# Altium schematic symbol library MiscPower.SchLib: 1552 symbols (part 7 of 22) (continued)
## LM3488QMMX/NOPB (continued)

## LM3492MH/NOPB
designator U?
Two-Channel Individual Dimmable LED Driver with Boost Converter and Fast Current Regulator, 20 pin TSSOP EXP PAD; PartNumber: LM3492MH/NOPB; Manufacturer: National Semiconductor; PackageTopMarking: NSUZXYTT*LM3492*MH; PowerWise: Y; CompType: MiscPower; DatasheetVersion: Oct-2010; PackageVersion: revC, Jul-2006; PackageReference: MXA20A; PackageDescription: Molded TSSOP, Jedec, 6.5 x 4.4 x 0.9mm Body, 20 Lead, 0.65mm Pitch, Exposed Pad; RoHS: Y; PinCount: 20; High-Reliability: Y; Code_JEDEC: MO-153-ACT; ComponentLink1Description: Manufacturer URL; ComponentLink1URL: http://www.national.com/; ComponentLink2Description: LM3492 Datasheet; ComponentLink2URL: http://www.national.com/ds/LM/LM3492.pdf; ComponentLink3Description: LM3492 Web Page; ComponentLink3URL: http://www.national.com/pf/LM/LM3492.html; ComponentLink4Description: MXA20A Package Page; ComponentLink4URL: http://www.national.com/packaging/folders/mxa20a.html
footprint MXA20A_N (TSOP, 20-Leads, Body 6.5x4.4mm, Pitch 0.65mm, Thermal Pad, IPC Medium Density)
footprint MXA20A_L (TSOP, 20-Leads, Body 6.5x4.4mm, Pitch 0.65mm, Thermal Pad, IPC High Density)
footprint MXA20A_M (TSOP, 20-Leads, Body 6.5x4.4mm, Pitch 0.65mm, Thermal Pad, IPC Low Density)
pins: 1 EN (in), 2 VIN (in), 3 SW (oc), 4 SW (oc), 5 VOUT (in), 6 RT, 7 FB (in), 8 GND (power), 9 IOUT2 (in), 10 IOUT1 (in), 11 CDHC, 12 IREF, 13 COMM (io), 14 LGND (power), 15 DIM1/CLK (in), 16 DIM2 (in), 17 PGND (power), 18 PGND (power), 19 VCC (power), 20 ILIM (in), 21 DAP (power)

## LM3492MHX/NOPB
designator U?
Two-Channel Individual Dimmable LED Driver with Boost Converter and Fast Current Regulator, 20 pin TSSOP EXP PAD; PartNumber: LM3492MHX/NOPB; Manufacturer: National Semiconductor; PackageTopMarking: NSUZXYTT*LM3492*MH; PowerWise: Y; CompType: MiscPower; DatasheetVersion: Oct-2010; PackageVersion: revC, Jul-2006; PackageReference: MXA20A; PackageDescription: Molded TSSOP, Jedec, 6.5 x 4.4 x 0.9mm Body, 20 Lead, 0.65mm Pitch, Exposed Pad; RoHS: Y; PinCount: 20; High-Reliability: Y; Code_JEDEC: MO-153-ACT; ComponentLink1Description: Manufacturer URL; ComponentLink1URL: http://www.national.com/; ComponentLink2Description: LM3492 Datasheet; ComponentLink2URL: http://www.national.com/ds/LM/LM3492.pdf; ComponentLink3Description: LM3492 Web Page; ComponentLink3URL: http://www.national.com/pf/LM/LM3492.html; ComponentLink4Description: MXA20A Package Page; ComponentLink4URL: http://www.national.com/packaging/folders/mxa20a.html
footprint MXA20A_N (TSOP, 20-Leads, Body 6.5x4.4mm, Pitch 0.65mm, Thermal Pad, IPC Medium Density)
footprint MXA20A_L (TSOP, 20-Leads, Body 6.5x4.4mm, Pitch 0.65mm, Thermal Pad, IPC High Density)
footprint MXA20A_M (TSOP, 20-Leads, Body 6.5x4.4mm, Pitch 0.65mm, Thermal Pad, IPC Low Density)
pins: 1 EN (in), 2 VIN (in), 3 SW (oc), 4 SW (oc), 5 VOUT (in), 6 RT, 7 FB (in), 8 GND (power), 9 IOUT2 (in), 10 IOUT1 (in), 11 CDHC, 12 IREF, 13 COMM (io), 14 LGND (power), 15 DIM1/CLK (in), 16 DIM2 (in), 17 PGND (power), 18 PGND (power), 19 VCC (power), 20 ILIM (in), 21 DAP (power)

## LM3492QMH/NOPB
designator U?
Two-Channel Individual Dimmable LED Driver with Boost Converter and Fast Current Regulator, AECQ 1, 20-pin TSSOP-EP, 73 Rail; PartNumber: LM3492QMH/NOPB; Manufacturer: National Semiconductor; PackageTopMarking: NSUZXYTT*LM3492*QMH; PowerWise: N; CompType: MiscPower; High-Reliability: Y; DatasheetVersion: Oct-2010; PackageVersion: revC, Jul-2006; PackageReference: MXA20A; PackageDescription: Molded TSSOP, Jedec, 6.5 x 4.4 x 0.9mm Body, 20 Lead, 0.65mm Pitch, Exposed Pad; RoHS: Y; PinCount: 20; Code_JEDEC: MO-153-ACT; ComponentLink1Description: Manufacturer URL; ComponentLink1URL: http://www.national.com/; ComponentLink2Description: LM3492 Datasheet; ComponentLink2URL: http://www.national.com/ds/LM/LM3492.pdf; ComponentLink3Description: LM3492 Web Page; ComponentLink3URL: http://www.national.com/pf/LM/LM3492.html; ComponentLink4Description: MXA20A Package Page; ComponentLink4URL: http://www.national.com/packaging/folders/mxa20a.html
footprint MXA20A_N (TSOP, 20-Leads, Body 6.5x4.4mm, Pitch 0.65mm, Thermal Pad, IPC Medium Density)
footprint MXA20A_L (TSOP, 20-Leads, Body 6.5x4.4mm, Pitch 0.65mm, Thermal Pad, IPC High Density)
footprint MXA20A_M (TSOP, 20-Leads, Body 6.5x4.4mm, Pitch 0.65mm, Thermal Pad, IPC Low Density)
pins: 1 EN (in), 2 VIN (in), 3 SW (oc), 4 SW (oc), 5 VOUT (in), 6 RT, 7 FB (in), 8 GND (power), 9 IOUT2 (in), 10 IOUT1 (in), 11 CDHC, 12 IREF, 13 COMM (io), 14 LGND (power), 15 DIM1/CLK (in), 16 DIM2 (in), 17 PGND (power), 18 PGND (power), 19 VCC (power), 20 ILIM (in), 21 DAP (power)

## LM3492QMHX/NOPB
designator U?
Two-Channel Individual Dimmable LED Driver with Boost Converter and Fast Current Regulator, AECQ 1, 20-pin TSSOP-EP, 2500 Reel; PartNumber: LM3492QMHX/NOPB; Manufacturer: National Semiconductor; PackageTopMarking: NSUZXYTT*LM3492*QMH; PowerWise: N; CompType: MiscPower; High-Reliability: Y; DatasheetVersion: Oct-2010; PackageVersion: revC, Jul-2006; PackageReference: MXA20A; PackageDescription: Molded TSSOP, Jedec, 6.5 x 4.4 x 0.9mm Body, 20 Lead, 0.65mm Pitch, Exposed Pad; RoHS: Y; PinCount: 20; Code_JEDEC: MO-153-ACT; ComponentLink1Description: Manufacturer URL; ComponentLink1URL: http://www.national.com/; ComponentLink2Description: LM3492 Datasheet; ComponentLink2URL: http://www.national.com/ds/LM/LM3492.pdf; ComponentLink3Description: LM3492 Web Page; ComponentLink3URL: http://www.national.com/pf/LM/LM3492.html; ComponentLink4Description: MXA20A Package Page; ComponentLink4URL: http://www.national.com/packaging/folders/mxa20a.html
footprint MXA20A_N (TSOP, 20-Leads, Body 6.5x4.4mm, Pitch 0.65mm, Thermal Pad, IPC Medium Density)
footprint MXA20A_L (TSOP, 20-Leads, Body 6.5x4.4mm, Pitch 0.65mm, Thermal Pad, IPC High Density)
footprint MXA20A_M (TSOP, 20-Leads, Body 6.5x4.4mm, Pitch 0.65mm, Thermal Pad, IPC Low Density)
pins: 1 EN (in), 2 VIN (in), 3 SW (oc), 4 SW (oc), 5 VOUT (in), 6 RT, 7 FB (in), 8 GND (power), 9 IOUT2 (in), 10 IOUT1 (in), 11 CDHC, 12 IREF, 13 COMM (io), 14 LGND (power), 15 DIM1/CLK (in), 16 DIM2 (in), 17 PGND (power), 18 PGND (power), 19 VCC (power), 20 ILIM (in), 21 DAP (power)

## LM3500TL-16/NOPB
designator U?
Synchronous Step-up DC/DC Converter for White LED Applications, 8-pin Micro SMD, Pb-Free; PartNumber: LM3500TL-16/NOPB; Manufacturer: National Semiconductor; PackageTopMarking: XVS*I 18; PowerWise: N; CompType: MiscPower; High-Reliability: Y; DatasheetVersion: Feb-2005; PackageVersion: revC, Jan-2004; PackageReference: TLA08SSA; PackageDescription: Thin Micro SMD, 8 Bump (Large), 0.5mm Pitch; RoHS: Y; PinCount: 8; Code_JEDEC: MO-211-DD; ComponentLink1Description: Manufacturer URL; ComponentLink1URL: http://www.national.com/; ComponentLink2Description: LM3500 Datasheet; ComponentLink2URL: http://www.national.com/ds/LM/LM3500.pdf; ComponentLink3Description: LM3500 Web Page; ComponentLink3URL: http://www.national.com/pf/LM/LM3500.html; ComponentLink4Description: TLA08SSA Package Page; ComponentLink4URL: http://www.national.com/packaging/folders/tla08ssa.html
footprint TLA08SSA (Micro SMD, 8-Leads, Body 1.92x1.92mm, Pitch 0.5mm, NSC Recommended)
pins: A1 AGND (power), A2 ~{SHDN} (in), A3 NC, B1 VIN (power), B3 FB (in), C1 VOUT (out), C2 VSW, C3 GND (power)

## LM3500TL-21/NOPB
designator U?
Synchronous Step-up DC/DC Converter for White LED Applications, 8-pin Micro SMD, Pb-Free; PartNumber: LM3500TL-21/NOPB; Manufacturer: National Semiconductor; PackageTopMarking: XVS*I 23; PowerWise: N; CompType: MiscPower; High-Reliability: Y; DatasheetVersion: Feb-2005; PackageVersion: revC, Jan-2004; PackageReference: TLA08SSA; PackageDescription: Thin Micro SMD, 8 Bump (Large), 0.5mm Pitch; RoHS: Y; PinCount: 8; Code_JEDEC: MO-211-DD; ComponentLink1Description: Manufacturer URL; ComponentLink1URL: http://www.national.com/; ComponentLink2Description: LM3500 Datasheet; ComponentLink2URL: http://www.national.com/ds/LM/LM3500.pdf; ComponentLink3Description: LM3500 Web Page; ComponentLink3URL: http://www.national.com/pf/LM/LM3500.html; ComponentLink4Description: TLA08SSA Package Page; ComponentLink4URL: http://www.national.com/packaging/folders/tla08ssa.html
footprint TLA08SSA (Micro SMD, 8-Leads, Body 1.92x1.92mm, Pitch 0.5mm, NSC Recommended)
pins: A1 AGND (power), A2 ~{SHDN} (in), A3 NC, B1 VIN (power), B3 FB (in), C1 VOUT (out), C2 VSW, C3 GND (power)

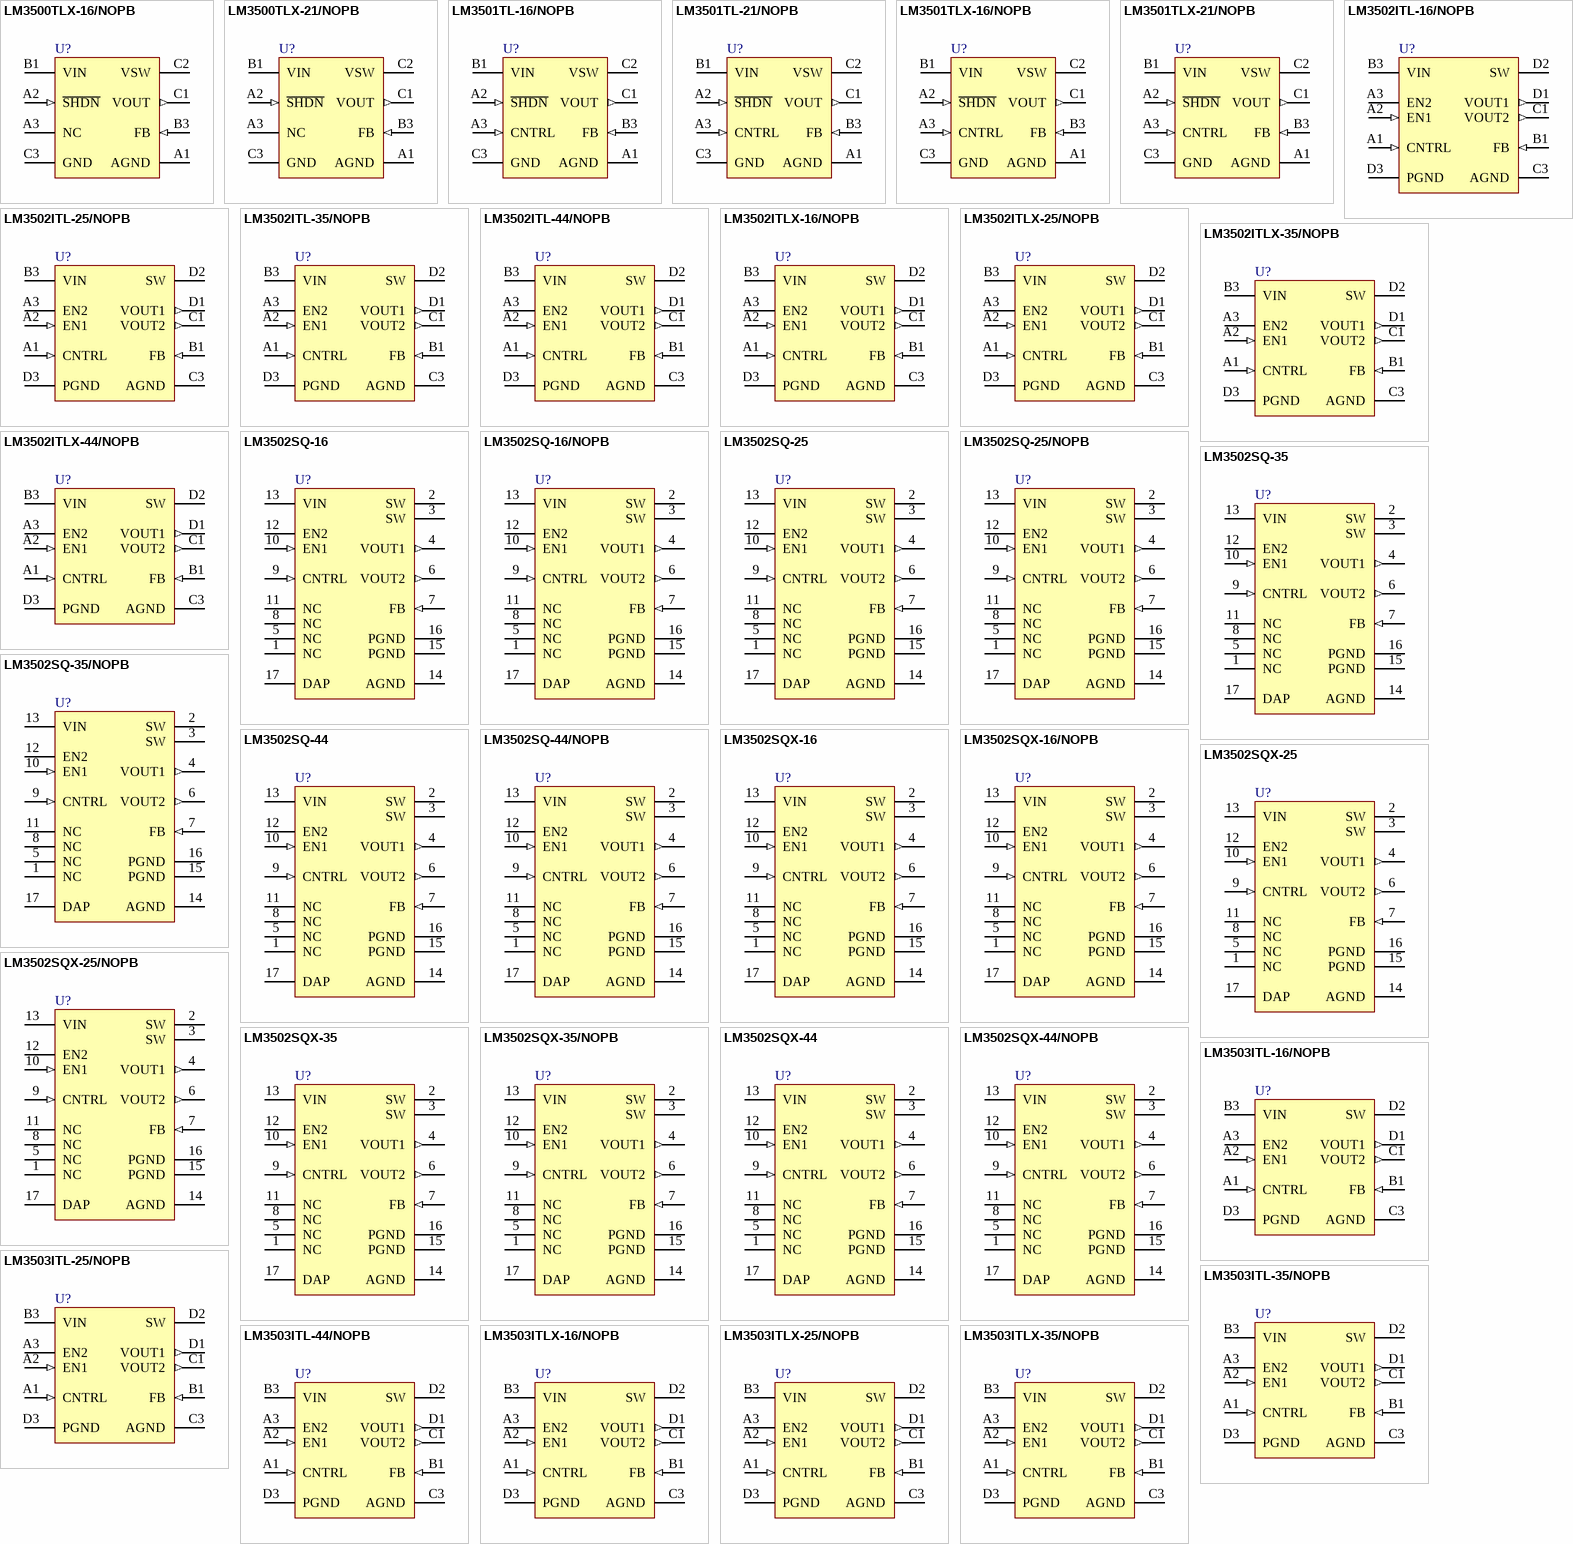
[diagram p15: symbols LM3500TLX-16/NOPB to LM3503ITLX-35/NOPB]

## LM3500TLX-16/NOPB
designator U?
Synchronous Step-up DC/DC Converter for White LED Applications, 8-pin Micro SMD, Pb-Free; PartNumber: LM3500TLX-16/NOPB; Manufacturer: National Semiconductor; PackageTopMarking: XVS*I 18; PowerWise: N; CompType: MiscPower; High-Reliability: Y; DatasheetVersion: Feb-2005; PackageVersion: revC, Jan-2004; PackageReference: TLA08SSA; PackageDescription: Thin Micro SMD, 8 Bump (Large), 0.5mm Pitch; RoHS: Y; PinCount: 8; Code_JEDEC: MO-211-DD; ComponentLink1Description: Manufacturer URL; ComponentLink1URL: http://www.national.com/; ComponentLink2Description: LM3500 Datasheet; ComponentLink2URL: http://www.national.com/ds/LM/LM3500.pdf; ComponentLink3Description: LM3500 Web Page; ComponentLink3URL: http://www.national.com/pf/LM/LM3500.html; ComponentLink4Description: TLA08SSA Package Page; ComponentLink4URL: http://www.national.com/packaging/folders/tla08ssa.html
footprint TLA08SSA (Micro SMD, 8-Leads, Body 1.92x1.92mm, Pitch 0.5mm, NSC Recommended)
pins: A1 AGND (power), A2 ~{SHDN} (in), A3 NC, B1 VIN (power), B3 FB (in), C1 VOUT (out), C2 VSW, C3 GND (power)

## LM3500TLX-21/NOPB
designator U?
Synchronous Step-up DC/DC Converter for White LED Applications, 8-pin Micro SMD, Pb-Free; PartNumber: LM3500TLX-21/NOPB; Manufacturer: National Semiconductor; PackageTopMarking: XVS*I 23; PowerWise: N; CompType: MiscPower; High-Reliability: Y; DatasheetVersion: Feb-2005; PackageVersion: revC, Jan-2004; PackageReference: TLA08SSA; PackageDescription: Thin Micro SMD, 8 Bump (Large), 0.5mm Pitch; RoHS: Y; PinCount: 8; Code_JEDEC: MO-211-DD; ComponentLink1Description: Manufacturer URL; ComponentLink1URL: http://www.national.com/; ComponentLink2Description: LM3500 Datasheet; ComponentLink2URL: http://www.national.com/ds/LM/LM3500.pdf; ComponentLink3Description: LM3500 Web Page; ComponentLink3URL: http://www.national.com/pf/LM/LM3500.html; ComponentLink4Description: TLA08SSA Package Page; ComponentLink4URL: http://www.national.com/packaging/folders/tla08ssa.html
footprint TLA08SSA (Micro SMD, 8-Leads, Body 1.92x1.92mm, Pitch 0.5mm, NSC Recommended)
pins: A1 AGND (power), A2 ~{SHDN} (in), A3 NC, B1 VIN (power), B3 FB (in), C1 VOUT (out), C2 VSW, C3 GND (power)

## LM3501TL-16/NOPB
designator U?
Synchronous Step-up DC/DC Converter for White LED Applications, 8-pin Micro SMD, Pb-Free; PartNumber: LM3501TL-16/NOPB; Manufacturer: National Semiconductor; PackageTopMarking: XVS*I 19; PowerWise: N; CompType: MiscPower; High-Reliability: Y; DatasheetVersion: May-2005; PackageVersion: revC, Jan-2004; PackageReference: TLA08SSA; PackageDescription: Thin Micro SMD, 8 Bump (Large), 0.5mm Pitch; RoHS: Y; PinCount: 8; Code_JEDEC: MO-211-DD; ComponentLink1Description: Manufacturer URL; ComponentLink1URL: http://www.national.com/; ComponentLink2Description: LM3501 Datasheet; ComponentLink2URL: http://www.national.com/ds/LM/LM3501.pdf; ComponentLink3Description: LM3501 Web Page; ComponentLink3URL: http://www.national.com/pf/LM/LM3501.html; ComponentLink4Description: TLA08SSA Package Page; ComponentLink4URL: http://www.national.com/packaging/folders/tla08ssa.html
footprint TLA08SSA (Micro SMD, 8-Leads, Body 1.92x1.92mm, Pitch 0.5mm, NSC Recommended)
pins: A1 AGND (power), A2 ~{SHDN} (in), A3 CNTRL (in), B1 VIN (power), B3 FB (in), C1 VOUT (out), C2 VSW, C3 GND (power)

## LM3501TL-21/NOPB
designator U?
Synchronous Step-up DC/DC Converter for White LED Applications, 8-pin Micro SMD, Pb-Free; PartNumber: LM3501TL-21/NOPB; Manufacturer: National Semiconductor; PackageTopMarking: XVS*I 30; PowerWise: N; CompType: MiscPower; High-Reliability: Y; DatasheetVersion: May-2005; PackageVersion: revC, Jan-2004; PackageReference: TLA08SSA; PackageDescription: Thin Micro SMD, 8 Bump (Large), 0.5mm Pitch; RoHS: Y; PinCount: 8; Code_JEDEC: MO-211-DD; ComponentLink1Description: Manufacturer URL; ComponentLink1URL: http://www.national.com/; ComponentLink2Description: LM3501 Datasheet; ComponentLink2URL: http://www.national.com/ds/LM/LM3501.pdf; ComponentLink3Description: LM3501 Web Page; ComponentLink3URL: http://www.national.com/pf/LM/LM3501.html; ComponentLink4Description: TLA08SSA Package Page; ComponentLink4URL: http://www.national.com/packaging/folders/tla08ssa.html
footprint TLA08SSA (Micro SMD, 8-Leads, Body 1.92x1.92mm, Pitch 0.5mm, NSC Recommended)
pins: A1 AGND (power), A2 ~{SHDN} (in), A3 CNTRL (in), B1 VIN (power), B3 FB (in), C1 VOUT (out), C2 VSW, C3 GND (power)

## LM3501TLX-16/NOPB
designator U?
Synchronous Step-up DC/DC Converter for White LED Applications, 8-pin Micro SMD, Pb-Free; PartNumber: LM3501TLX-16/NOPB; Manufacturer: National Semiconductor; PackageTopMarking: XVS*I 19; PowerWise: N; CompType: MiscPower; High-Reliability: Y; DatasheetVersion: May-2005; PackageVersion: revC, Jan-2004; PackageReference: TLA08SSA; PackageDescription: Thin Micro SMD, 8 Bump (Large), 0.5mm Pitch; RoHS: Y; PinCount: 8; Code_JEDEC: MO-211-DD; ComponentLink1Description: Manufacturer URL; ComponentLink1URL: http://www.national.com/; ComponentLink2Description: LM3501 Datasheet; ComponentLink2URL: http://www.national.com/ds/LM/LM3501.pdf; ComponentLink3Description: LM3501 Web Page; ComponentLink3URL: http://www.national.com/pf/LM/LM3501.html; ComponentLink4Description: TLA08SSA Package Page; ComponentLink4URL: http://www.national.com/packaging/folders/tla08ssa.html
footprint TLA08SSA (Micro SMD, 8-Leads, Body 1.92x1.92mm, Pitch 0.5mm, NSC Recommended)
pins: A1 AGND (power), A2 ~{SHDN} (in), A3 CNTRL (in), B1 VIN (power), B3 FB (in), C1 VOUT (out), C2 VSW, C3 GND (power)

## LM3501TLX-21/NOPB
designator U?
Synchronous Step-up DC/DC Converter for White LED Applications, 8-pin Micro SMD, Pb-Free; PartNumber: LM3501TLX-21/NOPB; Manufacturer: National Semiconductor; PackageTopMarking: XVS*I 30; PowerWise: N; CompType: MiscPower; High-Reliability: Y; DatasheetVersion: May-2005; PackageVersion: revC, Jan-2004; PackageReference: TLA08SSA; PackageDescription: Thin Micro SMD, 8 Bump (Large), 0.5mm Pitch; RoHS: Y; PinCount: 8; Code_JEDEC: MO-211-DD; ComponentLink1Description: Manufacturer URL; ComponentLink1URL: http://www.national.com/; ComponentLink2Description: LM3501 Datasheet; ComponentLink2URL: http://www.national.com/ds/LM/LM3501.pdf; ComponentLink3Description: LM3501 Web Page; ComponentLink3URL: http://www.national.com/pf/LM/LM3501.html; ComponentLink4Description: TLA08SSA Package Page; ComponentLink4URL: http://www.national.com/packaging/folders/tla08ssa.html
footprint TLA08SSA (Micro SMD, 8-Leads, Body 1.92x1.92mm, Pitch 0.5mm, NSC Recommended)
pins: A1 AGND (power), A2 ~{SHDN} (in), A3 CNTRL (in), B1 VIN (power), B3 FB (in), C1 VOUT (out), C2 VSW, C3 GND (power)

## LM3502ITL-16/NOPB
designator U?
Step-Up Converter for White LED Applications, 10-pin Micro SMD, Pb-Free; PartNumber: LM3502ITL-16/NOPB; Manufacturer: National Semiconductor; PackageTopMarking: XYTT*I SANB; PowerWise: Y; CompType: MiscPower; DatasheetVersion: Aug-2006; PackageVersion: revD, Mar-2004; PackageReference: TLP10RDA; PackageDescription: Thin Micro SMD, 10 Bump (Large), Periperal, 0.5mm Pitch; RoHS: Y; PinCount: 10; High-Reliability: Y; Code_JEDEC: MO-211-BD; ComponentLink1Description: Manufacturer URL; ComponentLink1URL: http://www.national.com/; ComponentLink2Description: LM3502 Datasheet; ComponentLink2URL: http://www.national.com/ds/LM/LM3502.pdf; ComponentLink3Description: LM3502 Web Page; ComponentLink3URL: http://www.national.com/pf/LM/LM3502.html; ComponentLink4Description: TLP10RDA Package Page; ComponentLink4URL: http://www.national.com/packaging/folders/tlp10rda.html
footprint TLP10RDA (Micro SMD, 10-Leads, Body 2.07x1.9mm, Pitch 0.5mm, NSC Recommended)
pins: A1 CNTRL (in), A2 EN1 (in), A3 EN2, B1 FB (in), B3 VIN (power), C1 VOUT2 (out), C3 AGND (power), D1 VOUT1 (out), D2 SW (power), D3 PGND (power)

## LM3502ITL-25/NOPB
designator U?
Step-Up Converter for White LED Applications, 10-pin Micro SMD, Pb-Free; PartNumber: LM3502ITL-25/NOPB; Manufacturer: National Semiconductor; PackageTopMarking: XYTT*I SAPB; PowerWise: Y; CompType: MiscPower; DatasheetVersion: Aug-2006; PackageVersion: revD, Mar-2004; PackageReference: TLP10RDA; PackageDescription: Thin Micro SMD, 10 Bump (Large), Periperal, 0.5mm Pitch; RoHS: Y; PinCount: 10; High-Reliability: Y; Code_JEDEC: MO-211-BD; ComponentLink1Description: Manufacturer URL; ComponentLink1URL: http://www.national.com/; ComponentLink2Description: LM3502 Datasheet; ComponentLink2URL: http://www.national.com/ds/LM/LM3502.pdf; ComponentLink3Description: LM3502 Web Page; ComponentLink3URL: http://www.national.com/pf/LM/LM3502.html; ComponentLink4Description: TLP10RDA Package Page; ComponentLink4URL: http://www.national.com/packaging/folders/tlp10rda.html
footprint TLP10RDA (Micro SMD, 10-Leads, Body 2.07x1.9mm, Pitch 0.5mm, NSC Recommended)
pins: A1 CNTRL (in), A2 EN1 (in), A3 EN2, B1 FB (in), B3 VIN (power), C1 VOUT2 (out), C3 AGND (power), D1 VOUT1 (out), D2 SW (power), D3 PGND (power)

## LM3502ITL-35/NOPB
designator U?
Step-Up Converter for White LED Applications, 10-pin Micro SMD, Pb-Free; PartNumber: LM3502ITL-35/NOPB; Manufacturer: National Semiconductor; PackageTopMarking: XYTT*I SARB; PowerWise: Y; CompType: MiscPower; DatasheetVersion: Aug-2006; PackageVersion: revD, Mar-2004; PackageReference: TLP10RDA; PackageDescription: Thin Micro SMD, 10 Bump (Large), Periperal, 0.5mm Pitch; RoHS: Y; PinCount: 10; High-Reliability: Y; Code_JEDEC: MO-211-BD; ComponentLink1Description: Manufacturer URL; ComponentLink1URL: http://www.national.com/; ComponentLink2Description: LM3502 Datasheet; ComponentLink2URL: http://www.national.com/ds/LM/LM3502.pdf; ComponentLink3Description: LM3502 Web Page; ComponentLink3URL: http://www.national.com/pf/LM/LM3502.html; ComponentLink4Description: TLP10RDA Package Page; ComponentLink4URL: http://www.national.com/packaging/folders/tlp10rda.html
footprint TLP10RDA (Micro SMD, 10-Leads, Body 2.07x1.9mm, Pitch 0.5mm, NSC Recommended)
pins: A1 CNTRL (in), A2 EN1 (in), A3 EN2, B1 FB (in), B3 VIN (power), C1 VOUT2 (out), C3 AGND (power), D1 VOUT1 (out), D2 SW (power), D3 PGND (power)

## LM3502ITL-44/NOPB
designator U?
Step-Up Converter for White LED Applications, 10-pin Micro SMD, Pb-Free; PartNumber: LM3502ITL-44/NOPB; Manufacturer: National Semiconductor; PackageTopMarking: XYTT*I SDLB; PowerWise: Y; CompType: MiscPower; DatasheetVersion: Aug-2006; PackageVersion: revD, Mar-2004; PackageReference: TLP10RDA; PackageDescription: Thin Micro SMD, 10 Bump (Large), Periperal, 0.5mm Pitch; RoHS: Y; PinCount: 10; High-Reliability: Y; Code_JEDEC: MO-211-BD; ComponentLink1Description: Manufacturer URL; ComponentLink1URL: http://www.national.com/; ComponentLink2Description: LM3502 Datasheet; ComponentLink2URL: http://www.national.com/ds/LM/LM3502.pdf; ComponentLink3Description: LM3502 Web Page; ComponentLink3URL: http://www.national.com/pf/LM/LM3502.html; ComponentLink4Description: TLP10RDA Package Page; ComponentLink4URL: http://www.national.com/packaging/folders/tlp10rda.html
footprint TLP10RDA (Micro SMD, 10-Leads, Body 2.07x1.9mm, Pitch 0.5mm, NSC Recommended)
pins: A1 CNTRL (in), A2 EN1 (in), A3 EN2, B1 FB (in), B3 VIN (power), C1 VOUT2 (out), C3 AGND (power), D1 VOUT1 (out), D2 SW (power), D3 PGND (power)

## LM3502ITLX-16/NOPB
designator U?
Step-Up Converter for White LED Applications, 10-pin Micro SMD, Pb-Free; PartNumber: LM3502ITLX-16/NOPB; Manufacturer: National Semiconductor; PackageTopMarking: XYTT*I SANB; PowerWise: Y; CompType: MiscPower; DatasheetVersion: Aug-2006; PackageVersion: revD, Mar-2004; PackageReference: TLP10RDA; PackageDescription: Thin Micro SMD, 10 Bump (Large), Periperal, 0.5mm Pitch; RoHS: Y; PinCount: 10; High-Reliability: Y; Code_JEDEC: MO-211-BD; ComponentLink1Description: Manufacturer URL; ComponentLink1URL: http://www.national.com/; ComponentLink2Description: LM3502 Datasheet; ComponentLink2URL: http://www.national.com/ds/LM/LM3502.pdf; ComponentLink3Description: LM3502 Web Page; ComponentLink3URL: http://www.national.com/pf/LM/LM3502.html; ComponentLink4Description: TLP10RDA Package Page; ComponentLink4URL: http://www.national.com/packaging/folders/tlp10rda.html
footprint TLP10RDA (Micro SMD, 10-Leads, Body 2.07x1.9mm, Pitch 0.5mm, NSC Recommended)
pins: A1 CNTRL (in), A2 EN1 (in), A3 EN2, B1 FB (in), B3 VIN (power), C1 VOUT2 (out), C3 AGND (power), D1 VOUT1 (out), D2 SW (power), D3 PGND (power)

## LM3502ITLX-25/NOPB
designator U?
Step-Up Converter for White LED Applications, 10-pin Micro SMD, Pb-Free; PartNumber: LM3502ITLX-25/NOPB; Manufacturer: National Semiconductor; PackageTopMarking: XYTT*I SAPB; PowerWise: Y; CompType: MiscPower; DatasheetVersion: Aug-2006; PackageVersion: revD, Mar-2004; PackageReference: TLP10RDA; PackageDescription: Thin Micro SMD, 10 Bump (Large), Periperal, 0.5mm Pitch; RoHS: Y; PinCount: 10; High-Reliability: Y; Code_JEDEC: MO-211-BD; ComponentLink1Description: Manufacturer URL; ComponentLink1URL: http://www.national.com/; ComponentLink2Description: LM3502 Datasheet; ComponentLink2URL: http://www.national.com/ds/LM/LM3502.pdf; ComponentLink3Description: LM3502 Web Page; ComponentLink3URL: http://www.national.com/pf/LM/LM3502.html; ComponentLink4Description: TLP10RDA Package Page; ComponentLink4URL: http://www.national.com/packaging/folders/tlp10rda.html
footprint TLP10RDA (Micro SMD, 10-Leads, Body 2.07x1.9mm, Pitch 0.5mm, NSC Recommended)
pins: A1 CNTRL (in), A2 EN1 (in), A3 EN2, B1 FB (in), B3 VIN (power), C1 VOUT2 (out), C3 AGND (power), D1 VOUT1 (out), D2 SW (power), D3 PGND (power)

## LM3502ITLX-35/NOPB
designator U?
Step-Up Converter for White LED Applications, 10-pin Micro SMD, Pb-Free; PartNumber: LM3502ITLX-35/NOPB; Manufacturer: National Semiconductor; PackageTopMarking: XYTT*I SARB; PowerWise: Y; CompType: MiscPower; DatasheetVersion: Aug-2006; PackageVersion: revD, Mar-2004; PackageReference: TLP10RDA; PackageDescription: Thin Micro SMD, 10 Bump (Large), Periperal, 0.5mm Pitch; RoHS: Y; PinCount: 10; High-Reliability: Y; Code_JEDEC: MO-211-BD; ComponentLink1Description: Manufacturer URL; ComponentLink1URL: http://www.national.com/; ComponentLink2Description: LM3502 Datasheet; ComponentLink2URL: http://www.national.com/ds/LM/LM3502.pdf; ComponentLink3Description: LM3502 Web Page; ComponentLink3URL: http://www.national.com/pf/LM/LM3502.html; ComponentLink4Description: TLP10RDA Package Page; ComponentLink4URL: http://www.national.com/packaging/folders/tlp10rda.html
footprint TLP10RDA (Micro SMD, 10-Leads, Body 2.07x1.9mm, Pitch 0.5mm, NSC Recommended)
pins: A1 CNTRL (in), A2 EN1 (in), A3 EN2, B1 FB (in), B3 VIN (power), C1 VOUT2 (out), C3 AGND (power), D1 VOUT1 (out), D2 SW (power), D3 PGND (power)

## LM3502ITLX-44/NOPB
designator U?
Step-Up Converter for White LED Applications, 10-pin Micro SMD, Pb-Free; PartNumber: LM3502ITLX-44/NOPB; Manufacturer: National Semiconductor; PackageTopMarking: XYTT*I SDLB; PowerWise: Y; CompType: MiscPower; DatasheetVersion: Aug-2006; PackageVersion: revD, Mar-2004; PackageReference: TLP10RDA; PackageDescription: Thin Micro SMD, 10 Bump (Large), Periperal, 0.5mm Pitch; RoHS: Y; PinCount: 10; High-Reliability: Y; Code_JEDEC: MO-211-BD; ComponentLink1Description: Manufacturer URL; ComponentLink1URL: http://www.national.com/; ComponentLink2Description: LM3502 Datasheet; ComponentLink2URL: http://www.national.com/ds/LM/LM3502.pdf; ComponentLink3Description: LM3502 Web Page; ComponentLink3URL: http://www.national.com/pf/LM/LM3502.html; ComponentLink4Description: TLP10RDA Package Page; ComponentLink4URL: http://www.national.com/packaging/folders/tlp10rda.html
footprint TLP10RDA (Micro SMD, 10-Leads, Body 2.07x1.9mm, Pitch 0.5mm, NSC Recommended)
pins: A1 CNTRL (in), A2 EN1 (in), A3 EN2, B1 FB (in), B3 VIN (power), C1 VOUT2 (out), C3 AGND (power), D1 VOUT1 (out), D2 SW (power), D3 PGND (power)

## LM3502SQ-16
designator U?
Step-Up Converter for White LED Applications, 16-pin LLP; PartNumber: LM3502SQ-16; Manufacturer: National Semiconductor; PackageTopMarking: NS*UZXYTT*L00048B; PowerWise: Y; CompType: MiscPower; DatasheetVersion: Aug-2006; PackageVersion: revA, Oct-2003; PackageReference: SQA16A; PackageDescription: LLP, Plastic, Quad, 4 x 4 x 0.8mm Body, 16 Lead, 0.5mm Pitch, No Pullback; RoHS: N; PinCount: 16; High-Reliability: Y; ComponentLink1Description: Manufacturer URL; ComponentLink1URL: http://www.national.com/; ComponentLink2Description: LM3502 Datasheet; ComponentLink2URL: http://www.national.com/ds/LM/LM3502.pdf; ComponentLink3Description: LM3502 Web Page; ComponentLink3URL: http://www.national.com/pf/LM/LM3502.html; ComponentLink4Description: SQA16A Package Page; ComponentLink4URL: http://www.national.com/packaging/folders/sqa16a.html
footprint SQA16A (QFN, 16-Leads, Body 4x4mm, Pitch 0.5mm, Thermal Pad 2.7x2.7mm, NSC Recommended)
pins: 1 NC, 2 SW (power), 3 SW (power), 4 VOUT1 (out), 5 NC, 6 VOUT2 (out), 7 FB (in), 8 NC, 9 CNTRL (in), 10 EN1 (in), 11 NC, 12 EN2, 13 VIN (power), 14 AGND (power), 15 PGND (power), 16 PGND (power), 17 DAP (power)

## LM3502SQ-16/NOPB
designator U?
Step-Up Converter for White LED Applications, 16-pin LLP, Pb-Free; PartNumber: LM3502SQ-16/NOPB; Manufacturer: National Semiconductor; PackageTopMarking: NS*UZXYTT*L00048B; PowerWise: Y; CompType: MiscPower; DatasheetVersion: Aug-2006; PackageVersion: revA, Oct-2003; PackageReference: SQA16A; PackageDescription: LLP, Plastic, Quad, 4 x 4 x 0.8mm Body, 16 Lead, 0.5mm Pitch, No Pullback; RoHS: Y; PinCount: 16; High-Reliability: Y; ComponentLink1Description: Manufacturer URL; ComponentLink1URL: http://www.national.com/; ComponentLink2Description: LM3502 Datasheet; ComponentLink2URL: http://www.national.com/ds/LM/LM3502.pdf; ComponentLink3Description: LM3502 Web Page; ComponentLink3URL: http://www.national.com/pf/LM/LM3502.html; ComponentLink4Description: SQA16A Package Page; ComponentLink4URL: http://www.national.com/packaging/folders/sqa16a.html
footprint SQA16A (QFN, 16-Leads, Body 4x4mm, Pitch 0.5mm, Thermal Pad 2.7x2.7mm, NSC Recommended)
pins: 1 NC, 2 SW (power), 3 SW (power), 4 VOUT1 (out), 5 NC, 6 VOUT2 (out), 7 FB (in), 8 NC, 9 CNTRL (in), 10 EN1 (in), 11 NC, 12 EN2, 13 VIN (power), 14 AGND (power), 15 PGND (power), 16 PGND (power), 17 DAP (power)